# Altium footprint library Hydra_Ref_pcb.PcbLib: 353 footprints (part 17 of 23)
Each footprint in its own frame and in the unit in brackets; x right, y up, seen from the top. Pads: shape width x height; smd on the part's side, far side on the other; paste and mask are expansions set on the pad; w line width, h text height; cw(c..) or ccw(c..) is an arc to the next point about the centre after c.
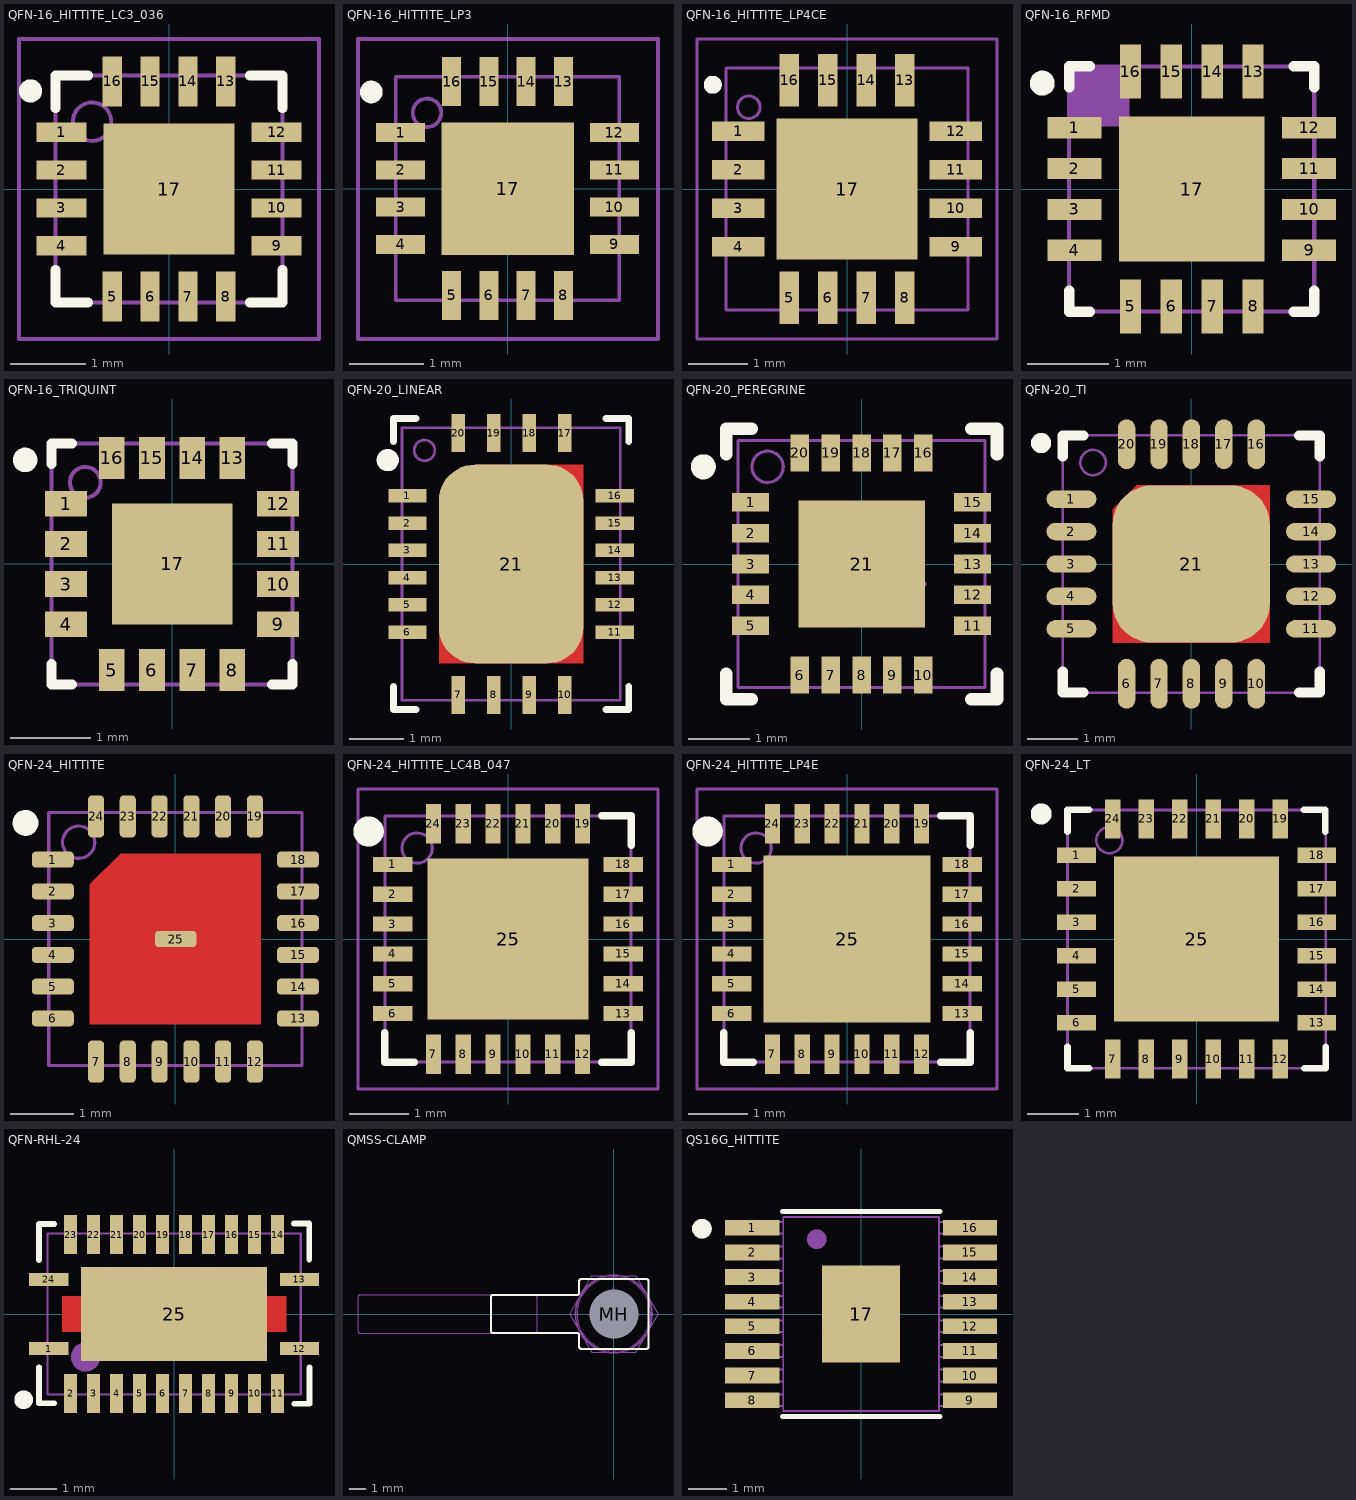
[diagram p16: the footprints below, top view; thin cyan lines are the x and y axes]

## QFN-16_HITTITE_LC3_036 [mil] "LC3 – 3 x 3 mm QFN CERAMIC  HIGH FREQUENCY SMT PACKAGE, 36mil height"
height 36
pads (17):
  rect 26x10 smd mask-13: 1(-56,29.55) 2(-56,9.85) 3(-56,-9.85) 4(-56,-29.55) 9(56,-29.55) 10(56,-9.85) 11(56,9.85) 12(56,29.55)
  rect 10x26 smd mask-13: 5(-29.55,-56) 6(-9.85,-56) 7(9.85,-56) 8(29.55,-56) 13(29.55,56) 14(9.85,56) 15(-9.85,56) 16(-29.55,56)
  rect 68x68 smd paste-34 mask-34: 17(0,0)
Top Overlay:
  circle w6: c-72,51 r3
  lines w5: -59,-42 -59,-59 -42,-59 ; -59,42 -59,59 -42,59 ; 42,-59 59,-59 59,-42 ; 42,59 59,59 59,42
Top Paste:
  region: -30,20 -20,30 30,30 30,-30 -30,-30
Top Solder:
  region: -30,20 -20,30 30,30 30,-30 -30,-30
  region: -38.5,69 -38.5,43.5 -34,39 34,39 38.5,43.5 38.5,69
  region: -69,-38.5 -43.5,-38.5 -39,-34 -39,34 -43.5,38.5 -69,38.5
  region: 38.5,-69 38.5,-43.5 34,-39 -34,-39 -38.5,-43.5 -38.5,-69
  region: 69,38.5 43.5,38.5 39,34 39,-34 43.5,-38.5 69,-38.5
  pour cut-out: -47.5,78 -47.5,47.5 -78,47.5 -78,-47.5 -47.5,-47.5 -47.5,-78 47.5,-78 47.5,-47.5 78,-47.5 78,47.5 47.5,47.5 47.5,78
9 Top Assy:
  circle w2: c-40,35 r10
  lines w2: -59.06,-59.06 59.06,-59.06 59.06,59.06 -59.06,59.06 -59.06,-59.06
  text ".Designator" at -43.74,-12.5 h25
15 Top Optical Placement:
  lines w2: -78,-78 78,-78 78,78 -78,78 -78,-78
  lines w3.94: -19.68,0 19.68,0 ; 0,-19.68 0,19.68
3D body: height 36, standoff 0, extent -59.04,-59.04 59.04,59.04

## QFN-16_HITTITE_LP3 [mil] "QFN-16 HITTITE"
height 39
pads (17):
  rect 26x10 smd paste+0 mask+0: 1(-56.5,29.53) 2(-56.5,9.84) 3(-56.5,-9.84) 4(-56.5,-29.53) 9(56.5,-29.53) 10(56.5,-9.84) 11(56.5,9.84) 12(56.5,29.53)
  rect 10x26 smd paste+0 mask+0: 5(-29.53,-56.5) 6(-9.84,-56.5) 7(9.84,-56.5) 8(29.53,-56.5) 13(29.53,56.5) 14(9.84,56.5) 15(-9.84,56.5) 16(-29.53,56.5)
  rect 70x70 smd paste-35 mask-35: 17(0,0)
Top Overlay:
  circle w6: c-72,51 r3
Top Paste:
  region: -29,19 -19,29 29,29 29,-29 -29,-29
Top Solder:
  region: -29,19 -19,29 29,29 29,-29 -29,-29
  region: 69.5,38.5 44,38.5 39.5,34 39.5,-34 44,-38.5 69.5,-38.5
  region: 38.5,-69.5 38.5,-44 34,-39.5 -34,-39.5 -38.5,-44 -38.5,-69.5
  region: -69.5,-38.5 -44,-38.5 -39.5,-34 -39.5,34 -44,38.5 -69.5,38.5
  region: -38.5,69.5 -38.5,44 -34,39.5 34,39.5 38.5,44 38.5,69.5
  pour cut-out: -48.5,79 -48.5,48.5 -79,48.5 -79,-48.5 -48.5,-48.5 -48.5,-79.5 48.5,-79.5 48.5,-48.5 79.5,-48.5 79.5,48.5 48.5,48.5 48.5,79
9 Top Assy:
  circle w2: c-42.54,40 r7.54
  lines w2: -59.06,-59.06 59.06,-59.06 59.06,59.06 -59.06,59.06 -59.06,-59.06
  text ".Designator" at -30,-9.84 h18
15 Top Optical Placement:
  lines w2: -79,-79.5 79.5,-79.5 79.5,79 -79,79 -79,-79.5
  lines w3.94: -19.68,0 19.68,0 ; 0,-19.68 0,19.68
3D body: height 39, standoff 0.39, extent -59.06,-59.06 59.23,59.06

## QFN-16_HITTITE_LP4CE [mil] "LP4C (E) – 4 x 4 mm QUAD FLATPACK  NO-LEAD (QFN) PLASTIC PACKAGE, 1mm"
height 39.37
pads (17):
  rect 35x13 smd paste+0 mask+0: 1(-72.5,38.39) 2(-72.5,12.8) 3(-72.5,-12.8) 4(-72.5,-38.39) 9(72.5,-38.39) 10(72.5,-12.8) 11(72.5,12.8) 12(72.5,38.39)
  rect 13x35 smd paste+0 mask+0: 5(-38.39,-72.5) 6(-12.8,-72.5) 7(12.8,-72.5) 8(38.39,-72.5) 13(38.39,72.5) 14(12.8,72.5) 15(-12.8,72.5) 16(-38.39,72.5)
  rect 94x94 smd paste-47 mask-47: 17(0,0)
Top Overlay:
  circle w6: c-89.5,69.5 r3
Top Paste:
  region: -40.5,26.5 -26.5,40.5 40.5,40.5 40.5,-40.5 -40.5,-40.5
Top Solder:
  pour cut-out: -60.5,100 -60.5,60.5 -100,60.5 -100,-60.5 -60.5,-60.5 -60.5,-100 60.5,-100 60.5,-60.5 100,-60.5 100,60.5 60.5,60.5 60.5,100
  region: -50.5,90 -50.5,55 -46,50.5 45.5,50.5 50.5,55.5 50.5,90
  region: -90,-50.5 -55.5,-50.5 -50.5,-45.5 -50.5,45.5 -55.5,50.5 -90,50.5
  region: 50.5,-90 50.5,-55.5 45.5,-50.5 -45.5,-50.5 -50,-55 -50,-90
  region: 90,50.5 55.5,50.5 50.5,45.5 50.5,-45.5 55.5,-50.5 90,-50.5
  region: -40.5,26.5 -26.5,40.5 40.5,40.5 40.5,-40.5 -40.5,-40.5
9 Top Assy:
  circle w2: c-65.5,54.5 r7.54
  lines w2: -80.71,-80.71 -80.71,80.71 80.71,80.71 80.71,-80.71 -80.71,-80.71
  text ".Designator" at -69.87,-9.84 h40
15 Top Optical Placement:
  lines w2: -100,-100 -100,100 100,100 100,-100 -100,-100
  lines w3.94: -19.68,0 19.68,0 ; 0,-19.68 0,19.68
3D body: height 39.37, standoff 0, extent -80.71,-80.71 80.92,80.71

## QFN-16_RFMD [mil] "QFN-16 RFMD"
height 36.42
pads (17):
  rect 26x10.24 smd mask+2: 1(-56.5,29.53) 2(-56.5,9.84) 3(-56.5,-9.84) 4(-56.5,-29.53) 9(56.5,-29.53) 10(56.5,-9.84) 11(56.5,9.84) 12(56.5,29.53)
  rect 10.24x26 smd mask+2: 5(-29.53,-56.5) 6(-9.84,-56.5) 7(9.84,-56.5) 8(29.53,-56.5) 13(29.53,56.5) 14(9.84,56.5) 15(-9.84,56.5) 16(-29.53,56.5)
  rect 70x70 smd mask-6: 17(0,0)
Top Overlay:
  circle w6: c-72,51 r3
  lines w5: -59.06,-49.06 -59.06,-59.06 -49.06,-59.06 ; -59.06,49.06 -59.06,59.06 -49.06,59.06 ; 49.06,-59.06 59.06,-59.06 59.06,-49.06 ; 49.06,59.06 59.06,59.06 59.06,49.06
9 Top Assy:
  rectangle: -59.06,30 -30,59.06
  lines w2: -59.06,-59.06 59.06,-59.06 59.06,59.06 -59.06,59.06 -59.06,-59.06
  text ".Designator" at -30,-9.84 h18
3D body: height 36.42, standoff 0.39, extent -59.06,-59.06 59.23,59.06

## QFN-16_TRIQUINT [mm] "QFN-16 TRIQUINT"
height 0.851
pads (17):
  rect 0.52x0.32 smd paste-0.006 mask+0.032: 1(-1.32,0.75) 2(-1.32,0.25) 3(-1.32,-0.25) 4(-1.32,-0.75) 9(1.32,-0.75) 10(1.32,-0.25) 11(1.32,0.25) 12(1.32,0.75)
  rect 0.32x0.52 smd paste-0.006 mask+0.032: 5(-0.75,-1.32) 6(-0.25,-1.32) 7(0.25,-1.32) 8(0.75,-1.32) 13(0.75,1.32) 14(0.25,1.32) 15(-0.25,1.32) 16(-0.75,1.32)
  rect 1.5x1.5 smd mask+0.051: 17(0,0)
Top Overlay:
  circle w0.152: c-1.829,1.295 r0.076
  lines w0.127: -1.5,-1.246 -1.5,-1.5 -1.246,-1.5 ; -1.5,1.246 -1.5,1.5 -1.246,1.5 ; 1.246,-1.5 1.5,-1.5 1.5,-1.246 ; 1.246,1.5 1.5,1.5 1.5,1.246
Top Solder:
  pour cut-out: -1.829,1.829 1.829,1.829 1.829,-1.829 -1.829,-1.829
9 Top Assy:
  circle w0.051: c-1.081,1.016 r0.192
  lines w0.051: -1.5,-1.5 1.5,-1.5 1.5,1.5 -1.5,1.5 -1.5,-1.5
  text ".Designator" at -0.762,-0.25 h0.46
3D body: height 0.85, standoff 0.01, extent -1.5,-1.5 1.504,1.5

## QFN-20_LINEAR [mm] "QFN-20 TEXAS INSTRUMENTS"
height 1.016
pads (21):
  rect 0.7x0.25 smd mask+0.051: 1(-1.9,1.25) 2(-1.9,0.75) 3(-1.9,0.25) 4(-1.9,-0.25) 5(-1.9,-0.75) 6(-1.9,-1.25) 11(1.9,-1.25) 12(1.9,-0.75) 13(1.9,-0.25) 14(1.9,0.25) 15(1.9,0.75) 16(1.9,1.25)
  rect 0.25x0.7 smd mask+0.051: 7(-0.968,-2.4) 8(-0.318,-2.4) 9(0.332,-2.4) 10(0.982,-2.4) 17(0.982,2.4) 18(0.332,2.4) 19(-0.318,2.4) 20(-0.968,2.4)
  rrect50% 2.65x3.65 smd mask-0.051: 21(0,0)
Top Layer:
  rectangle: -0.66,-1.825 1.325,1.825
  rectangle: -1.325,-1.825 1.325,-0.838
Top Overlay:
  circle w0.203: c-2.261,1.905 r0.102
  lines w0.127: -2.157,-2.249 -2.157,-2.667 -1.739,-2.667 ; -2.157,2.249 -2.157,2.667 -1.739,2.667 ; 1.739,-2.667 2.157,-2.667 2.157,-2.249 ; 1.739,2.667 2.157,2.667 2.157,2.249
Top Solder:
  rectangle: -1.27,-1.778 1.27,1.25
  region: 1.27,1.778 0,1.778 0,-1.25 1.27,-1.25
9 Top Assy:
  circle w0.051: c-1.587,2.083 r0.19
  lines w0.051: -2,-2.5 -2,2.5 2,2.5 2,-2.5 -2,-2.5
  text ".Designator" at -1.27,-0.326 h0.46
15 Top Optical Placement:
  lines w0.1: -0.001,-0.326 0.999,-0.326 ; 0.499,-0.826 0.499,0.174
3D body: height 0.76, standoff 0.01, extent -2,-2.5 2.002,2.5

## QFN-20_PEREGRINE [mm] "QFN-20 TPEREGRINE SEMICONDUCTOR"
height 1.016
pads (21):
  rect 0.6x0.3 smd mask+0.051: 1(-1.8,1) 2(-1.8,0.5) 3(-1.8,0) 4(-1.8,-0.5) 5(-1.8,-1) 11(1.8,-1) 12(1.8,-0.5) 13(1.8,0) 14(1.8,0.5) 15(1.8,1)
  rect 0.3x0.6 smd mask+0.051: 6(-1,-1.8) 7(-0.5,-1.8) 8(0.004,-1.8) 9(0.5,-1.8) 10(1,-1.8) 16(1,1.8) 17(0.5,1.8) 18(0.004,1.8) 19(-0.5,1.8) 20(-1,1.8)
  rect 2.05x2.05 smd mask+0.102: 21(0,0)
Top Overlay:
  circle w0.203: c-2.565,1.575 r0.102
  lines w0.203: -2.194,-1.776 -2.194,-2.194 -1.776,-2.194 ; -2.194,1.776 -2.194,2.194 -1.776,2.194 ; 1.776,-2.194 2.194,-2.194 2.194,-1.776 ; 1.776,2.194 2.194,2.194 2.194,1.776
9 Top Assy:
  circle w0.051: c-1.524,1.575 r0.254
  lines w0.051: -2,-2 -2,2 2,2 2,-2 -2,-2
  text ".Designator" at -1.27,-0.326 h0.46
15 Top Optical Placement:
  lines w0.1: -0.001,-0.326 0.999,-0.326 ; 0.499,-0.826 0.499,0.174
3D body: height 1.02, standoff 0.01, extent -2,-2 2.007,2

## QFN-20_TI [mm] "QFN-20 TEXAS INSTRUMENTS"
height 1.016
pads (21):
  oval 1x0.35 smd mask+0.051: 1(-2.4,1.3) 2(-2.4,0.65) 3(-2.4,0) 4(-2.4,-0.65) 5(-2.4,-1.3) 11(2.4,-1.3) 12(2.4,-0.65) 13(2.4,0) 14(2.4,0.65) 15(2.4,1.3)
  oval 0.35x1 smd mask+0.051: 6(-1.296,-2.4) 7(-0.646,-2.4) 8(0.004,-2.4) 9(0.654,-2.4) 10(1.304,-2.4) 16(1.304,2.4) 17(0.654,2.4) 18(0.004,2.4) 19(-0.646,2.4) 20(-1.296,2.4)
  rrect50% 3.15x3.15 smd mask+0.051: 21(0,0)
Top Layer:
  region: 1.575,1.575 -1.092,1.575 -1.575,1.092 -1.575,-1.575 1.575,-1.575
Top Overlay:
  circle w0.203: c-3.009,2.423 r0.102
  lines w0.203: -2.575,-2.157 -2.575,-2.575 -2.157,-2.575 ; -2.575,2.157 -2.575,2.575 -2.157,2.575 ; 2.157,-2.575 2.575,-2.575 2.575,-2.157 ; 2.157,2.575 2.575,2.575 2.575,2.157
Top Solder:
  rectangle: -1.626,-1.626 1.626,1.626
9 Top Assy:
  circle w0.051: c-1.967,2.032 r0.254
  lines w0.051: -2.575,-2.575 2.575,-2.575 2.575,2.575 -2.575,2.575 -2.575,-2.575
  text ".Designator" at -1.27,-0.326 h0.46
15 Top Optical Placement:
  lines w0.1: -0.001,-0.326 0.999,-0.326 ; 0.499,-0.826 0.499,0.174
3D body: height 0.76, standoff 0.01, extent -2.575,-2.575 2.582,2.575

## QFN-24_HITTITE [mil] "QFN-24 HITTITE"
height 40
pads (25):
  rrect50% 26x10 smd mask+2: 1(-76,49.25) 2(-76,29.55) 3(-76,9.85) 4(-76,-9.85) 5(-76,-29.55) 6(-76,-49.25) 13(76,-49.25) 14(76,-29.55) 15(76,-9.85) 16(76,9.85) 17(76,29.55) 18(76,49.25) 25(0.17,0)
  rrect50% 10x26 smd mask+2: 7(-49.25,-76) 8(-29.55,-76) 9(-9.85,-76) 10(9.85,-76) 11(29.55,-76) 12(49.25,-76) 19(49.25,76) 20(29.55,76) 21(9.85,76) 22(-9.85,76) 23(-29.55,76) 24(-49.25,76)
Top Layer:
  region: 53,53 -34,53 -53,34 -53,-53 53,-53
Top Overlay:
  circle w8: c-93,72 r4
Top Paste:
  rectangle: -41,-41 41,41
Top Solder:
  rectangle: -49,-49 49,49
9 Top Assy:
  circle w2: c-60,60 r10
  lines w2: -78.5,-78.5 -78.5,78.5 78.5,78.5 78.5,-78.5 -78.5,-78.5
  text ".Designator" at -68,-16 h50
15 Top Optical Placement:
  lines w3.94: -0.03,-12.83 39.34,-12.83 ; 19.65,-32.51 19.65,6.86
3D body: height 40, standoff 0.39, extent -78.5,-78.5 78.52,78.5

## QFN-24_HITTITE_LC4B_047 [mil] "LC4B – 4 x 4 mm QFN CERAMIC  HIGH FREQUENCY SMT PACKAGE, 47mil height"
height 47
pads (25):
  rect 26x10 smd mask-13: 1(-76,49.25) 2(-76,29.55) 3(-76,9.85) 4(-76,-9.85) 5(-76,-29.55) 6(-76,-49.25) 13(76,-49.25) 14(76,-29.55) 15(76,-9.85) 16(76,9.85) 17(76,29.55) 18(76,49.25)
  rect 10x26 smd mask-13: 7(-49.25,-76) 8(-29.55,-76) 9(-9.85,-76) 10(9.85,-76) 11(29.55,-76) 12(49.25,-76) 19(49.25,76) 20(29.55,76) 21(9.85,76) 22(-9.85,76) 23(-29.55,76) 24(-49.25,76)
  rect 106x106 smd paste-53 mask-53: 25(0,0)
Top Overlay:
  circle w10: c-92,71 r5
  lines w5: -81.3,-62 -81.3,-81.3 -62,-81.3 ; 62,-81.3 81.3,-81.3 81.3,-62 ; 62,81.3 81.3,81.3 81.3,62
Top Paste:
  region: -49,29 -29,49 49,49 49,-49 -49,-49
Top Solder:
  pour cut-out: -68,99 -68,68 -99,68 -99,-68 -68,-68 -68,-99 68,-99 68,-68 99,-68 99,68 68,68 68,99
  region: -49,29 -29,49 49,49 49,-49 -49,-49
  region: -58,-89 -58,-62 -55,-59 55,-59 58,-62 58,-89
  region: 89,-58 62,-58 59,-55 59,55 62,58 89,58
  region: 58,89 58,62 55,59 -55,59 -58,62 -58,89
  region: -89,58 -62,58 -59,55 -59,-55 -62,-58 -89,-58
9 Top Assy:
  circle w2: c-60,60 r10
  lines w2: -81.3,-81.3 -81.3,81.3 81.3,81.3 81.3,-81.3 -81.3,-81.3
  text ".Designator" at -69.97,-19.99 h40
15 Top Optical Placement:
  lines w2: -99,-99 -99,99 99,99 99,-99 -99,-99
  lines w3.94: -19.68,0 19.68,0 ; 0,-19.68 0,19.68
3D body: height 47, standoff 0, extent -81.28,-81.28 81.28,81.28

## QFN-24_HITTITE_LP4E [mil] "LLP4 (E) – 4 x 4 mm QUAD FLATPACK  NO-LEAD (QFN) PLASTIC PACKAGE, 39mil height"
height 39
pads (25):
  rect 26x10 smd mask-13: 1(-76,49.25) 2(-76,29.55) 3(-76,9.85) 4(-76,-9.85) 5(-76,-29.55) 6(-76,-49.25) 13(76,-49.25) 14(76,-29.55) 15(76,-9.85) 16(76,9.85) 17(76,29.55) 18(76,49.25)
  rect 10x26 smd mask-13: 7(-49.25,-76) 8(-29.55,-76) 9(-9.85,-76) 10(9.85,-76) 11(29.55,-76) 12(49.25,-76) 19(49.25,76) 20(29.55,76) 21(9.85,76) 22(-9.85,76) 23(-29.55,76) 24(-49.25,76)
  rect 110x110 smd paste-55 mask-55: 25(0,0)
Top Overlay:
  circle w10: c-92,71 r5
  lines w5: -81.3,-62 -81.3,-81.3 -62,-81.3 ; 62,-81.3 81.3,-81.3 81.3,-62 ; 62,81.3 81.3,81.3 81.3,62
Top Paste:
  region: -49,29 -29,49 49,49 49,-49 -49,-49
Top Solder:
  pour cut-out: -68,99 -68,68 -99,68 -99,-68 -68,-68 -68,-99 68,-99 68,-68 99,-68 99,68 68,68 68,99
  region: -89,58 -62,58 -59,55 -59,-55 -62,-58 -89,-58
  region: 58,89 58,62 55,59 -55,59 -58,62 -58,89
  region: 89,-58 62,-58 59,-55 59,55 62,58 89,58
  region: -58,-89 -58,-62 -55,-59 55,-59 58,-62 58,-89
  region: -49,29 -29,49 49,49 49,-49 -49,-49
9 Top Assy:
  circle w2: c-60,60 r10
  lines w2: -81.3,-81.3 81.3,-81.3 81.3,81.3 -81.3,81.3 -81.3,-81.3
  text ".Designator" at -69.97,-19.99 h40
15 Top Optical Placement:
  lines w2: -99,-99 99,-99 99,99 -99,99 -99,-99
  lines w3.94: -19.68,0 19.68,0 ; 0,-19.68 0,19.68
3D body: height 39, standoff 0, extent -81.28,-81.28 81.28,81.28

## QFN-24_LT [mm] "QFN-24 LINEAR TECHNOLOGY"
height 0.762
pads (25):
  rect 0.75x0.3 smd mask+0.051: 1(-2.325,1.624) 2(-2.325,0.974) 3(-2.325,0.324) 4(-2.325,-0.326) 5(-2.325,-0.976) 6(-2.325,-1.626) 13(2.325,-1.626) 14(2.325,-0.976) 15(2.325,-0.326) 16(2.325,0.324) 17(2.325,0.974) 18(2.325,1.624)
  rect 0.3x0.75 smd mask+0.051: 7(-1.626,-2.325) 8(-0.976,-2.325) 9(-0.326,-2.325) 10(0.324,-2.325) 11(0.974,-2.325) 12(1.624,-2.325) 19(1.624,2.325) 20(0.974,2.325) 21(0.324,2.325) 22(-0.326,2.325) 23(-0.976,2.325) 24(-1.626,2.325)
  rect 3.2x3.2 smd mask+0.051: 25(0,-0.001)
Top Overlay:
  circle w0.203: c-3.009,2.423 r0.102
  lines w0.127: -2.501,-2.083 -2.501,-2.501 -2.083,-2.501 ; -2.501,2.081 -2.501,2.499 -2.083,2.499 ; 2.075,2.499 2.493,2.499 2.493,2.081 ; 2.083,-2.501 2.501,-2.501 2.501,-2.083
9 Top Assy:
  circle w0.051: c-1.688,1.915 r0.254
  lines w0.051: -2.501,-2.501 2.499,-2.501 2.499,2.499 -2.501,2.499 -2.501,-2.501
  text ".Designator" at -1.859,-0.154 h0.46
15 Top Optical Placement:
  lines w0.1: -0.001,-0.326 0.999,-0.326 ; 0.499,-0.826 0.499,0.174
3D body: height 0.76, standoff 0.01, extent -2.501,-2.501 2.501,2.499

## QFN-RHL-24 [mm] "RHL (R-PVQFN-N24); 5.5 X 3.5 MM"
height 1
pads (25):
  rect 0.85x0.28 smd mask+0.051: 1(-2.725,-0.75) 12(2.725,-0.75) 13(2.725,0.75) 24(-2.725,0.75)
  rect 0.28x0.85 smd mask+0.051: 2(-2.25,-1.725) 3(-1.75,-1.725) 4(-1.25,-1.725) 5(-0.75,-1.725) 6(-0.25,-1.725) 7(0.25,-1.725) 8(0.75,-1.725) 9(1.25,-1.725) 10(1.75,-1.725) 11(2.25,-1.725) 14(2.25,1.725) 15(1.75,1.725) 16(1.25,1.725) 17(0.75,1.725) 18(0.25,1.725) 19(-0.25,1.725) 20(-0.75,1.725) 21(-1.25,1.725) 22(-1.75,1.725) 23(-2.25,1.725)
  rect 4.05x2.05 smd mask-0.102: 25(0,0)
Top Layer:
  region: 2.438,0.387 1.651,0.387 1.651,-0.387 2.438,-0.387
  rectangle: -2.438,-0.387 -1.651,0.387
Top Overlay:
  circle w0.203: c-3.269,-1.863 r0.102
  lines w0.127: -2.937,-1.157 -2.937,-1.941 -2.605,-1.941 ; -2.938,1.175 -2.938,1.959 -2.606,1.959 ; 2.606,1.966 2.938,1.966 2.938,1.181 ; 2.613,-1.95 2.945,-1.95 2.945,-1.166
9 Top Assy:
  circle w0.381: c-1.926,-0.934 r0.127
  lines w0.051: -2.75,-1.75 2.75,-1.75 2.75,1.75 -2.75,1.75 -2.75,-1.75
  text ".Designator" at -2.582,-0.389 h1.47
3D body: height 1, standoff 0.01, extent -2.75,-1.75 2.75,1.75

## QMSS-CABLE-PROXY_A1 [mil]
3D body: height 583.6, standoff -906.4, extent -1900,-920 1900,290

## QMSS-CLAMP [mil] "connector retaining clip, KFHS-440-12 stud, nut"
height 750
pads (1):
  round 112 / inner round 112 / far side round 180 hole 120 unplated: MH(0,0)
Top Overlay:
  lines w5: -300,-41.5 ccw(c-295,-41.5) -295,-46.5 -90,-46.5 cw(c-90,-51.5) -85,-51.5 -85,-80 ccw(c-80,-80) -80,-85 80,-85 ccw(c80,-80) 85,-80 85,80 ccw(c80,80) 80,85 -80,85 ccw(c-80,80) -85,80 -85,51.5 cw(c-90,51.5) -90,46.5 -295,46.5 ccw(c-295,41.5) -300,41.5 -300,-41.5
Bottom Overlay:
  circle w5: c0,0 r95
8 Bott Assy:
  circle w2: c0,0 r95
9 Top Assy:
  lines w2: -300,-41.5 ccw(c-295,-41.5) -295,-46.5 -90,-46.5 cw(c-90,-51.5) -85,-51.5 -85,-80 ccw(c-80,-80) -80,-85 80,-85 ccw(c80,-80) 85,-80 85,80 ccw(c80,80) 80,85 -80,85 ccw(c-80,80) -85,80 -85,51.5 cw(c-90,51.5) -90,46.5 -295,46.5 ccw(c-295,41.5) -300,41.5 -300,-41.5
  text ".Designator" at -285,-19.99 h40
15 Top Optical Placement:
  lines w2: -65,0 0,0 ; 0,-65 0,0 ; 0,65 0,0 ; 65,0 0,0 ; -300,-41.5 ccw(c-295,-41.5) -295,-46.5 -90,-46.5 cw(c-90,-51.5) -85,-51.5 -85,-80 ccw(c-80,-80) -80,-85 80,-85 ccw(c80,-80) 85,-80 85,80 ccw(c80,80) 80,85 -80,85 ccw(c-80,80) -85,80 -85,51.5 cw(c-90,51.5) -90,46.5 -295,46.5 ccw(c-295,41.5) -300,41.5 -300,-41.5
Mechanical 29:
  circle w2: c0,0 r90
  lines w2: -295,-46.5 cw(c-295,-41.5) -300,-41.5 -300,41.5 cw(c-295,41.5) -295,46.5 ; -58.89,-85 -53.98,-93.5 53.98,-93.5 58.89,-85 ; -58.89,85 -53.98,93.5 53.98,93.5 58.89,85 ; -37.69,-85.02 ccw(c0,0) 37.69,-85.02 ; -37.69,85.02 cw(c0,0) 37.69,85.02 ; -29.49,-85 -80,-85 cw(c-80,-80) -85,-80 -85,-51.5 ccw(c-90,-51.5) -90,-46.5 -620,-46.5 cw(c-620,-41.5) -625,-41.5 -625,41.5 cw(c-620,41.5) -620,46.5 -90,46.5 ccw(c-90,51.5) -85,51.5 -85,80 cw(c-80,80) -80,85 -29.49,85 ; 29.49,-85 80,-85 ccw(c80,-80) 85,-80 85,-29.49 ; 29.49,85 80,85 cw(c80,80) 85,80 85,29.49 ; 85,-39.78 107.96,0 85,39.78 ; 85.01,-37.71 ccw(c0,0) 85.01,37.71
  text "QMSS-CLAMP" at -317.55,-15 h30
Mechanical 30:
  circle w2: c0,0 r93
  circle w2: c0,0 r56
  circle w2: c0,0 r41.1
  circle w2: c0,0 r16.8
  lines w2: -192.5,-46.5 ccw(c-192.5,-41.5) -187.5,-41.5 -187.5,41.5 ccw(c-192.5,41.5) -192.5,46.5 ; -58.89,-85 -80,-85 cw(c-80,-80) -85,-80 -85,-51.5 ccw(c-90,-51.5) -90,-46.5 -620,-46.5 cw(c-620,-41.5) -625,-41.5 -625,41.5 cw(c-620,41.5) -620,46.5 -90,46.5 ccw(c-90,51.5) -85,51.5 -85,80 cw(c-80,80) -80,85 -58.89,85 ; 58.89,-85 80,-85 ccw(c80,-80) 85,-80 85,-39.78 ; 58.89,85 80,85 cw(c80,80) 85,80 85,39.78 ; -107.96,0 -53.98,93.5 53.98,93.5 107.96,0 53.98,-93.5 -53.98,-93.5 -107.96,0
  text "QMSS-CLAMP" at -607.45,-15 h30
Mechanical 31:
  circle w2: c0,0 r56
3D body: height 0, standoff -750, extent -55.98,-55.98 55.98,55.98
3D body: height 540, standoff 480, extent -107.96,-93.5 107.96,93.5
3D body: height 480, standoff 0, extent -299.98,-84.98 84.98,84.98
3D body: height 600, standoff 480, extent -299.98,-46.48 -187.52,46.48
3D body: height 750, standoff 600, extent -624.98,-46.48 -187.52,46.48
3D body: height 20, standoff 0, extent -89.98,-89.98 89.98,89.98

## QS16G_HITTITE [mil] "Hittite 16+1 Pin Plastic SSOP"
height 69
pads (17):
  rect 55x16 smd: 1(-110.5,87.5) 2(-110.5,62.5) 3(-110.5,37.5) 4(-110.5,12.5) 5(-110.5,-12.5) 6(-110.5,-37.5) 7(-110.5,-62.5) 8(-110.5,-87.5) 9(110.5,-87.5) 10(110.5,-62.5) 11(110.5,-37.5) 12(110.5,-12.5) 13(110.5,12.5) 14(110.5,37.5) 15(110.5,62.5) 16(110.5,87.5)
  rect 79x98 smd: 17(0,0)
Top Overlay:
  circle w10: c-161.57,86.61 r5
  lines w5: -80,-104 80,-104 ; -80,104 80,104
9 Top Assy:
  circle w10: c-45,76 r5
  lines w2: -100,-93.5 -100,-81.5 ; -100,-68.5 -100,-56.5 ; -100,-43.5 -100,-31.5 ; -100,-18.5 -100,-6.5 ; -100,6.5 -100,18.5 ; -100,31.5 -100,43.5 ; -100,56.5 -100,68.5 ; -100,81.5 -100,93.5 ; -79,-93.5 -115,-93.5 -115,-81.5 -79,-81.5 ; -79,-68.5 -115,-68.5 -115,-56.5 -79,-56.5 ; -79,-43.5 -115,-43.5 -115,-31.5 -79,-31.5 ; -79,-18.5 -115,-18.5 -115,-6.5 -79,-6.5 ; -79,0 -79,12.5 ; -79,6.5 -115,6.5 -115,18.5 -79,18.5 ; -79,31.5 -115,31.5 -115,43.5 -79,43.5 ; -79,56.5 -115,56.5 -115,68.5 -79,68.5 ; -79,81.5 -115,81.5 -115,93.5 -79,93.5 ; 79,-93.5 115,-93.5 115,-81.5 79,-81.5 ; 79,-68.5 115,-68.5 115,-56.5 79,-56.5 ; 79,-43.5 115,-43.5 115,-31.5 79,-31.5 ; 79,-18.5 115,-18.5 115,-6.5 79,-6.5 ; 79,0 79,12.5 ; 79,6.5 115,6.5 115,18.5 79,18.5 ; 79,31.5 115,31.5 115,43.5 79,43.5 ; 79,56.5 115,56.5 115,68.5 79,68.5 ; 79,81.5 115,81.5 115,93.5 79,93.5 ; 100,-93.5 100,-81.5 ; 100,-68.5 100,-56.5 ; 100,-43.5 100,-31.5 ; 100,-18.5 100,-6.5 ; 100,6.5 100,18.5 ; 100,31.5 100,43.5 ; 100,56.5 100,68.5 ; 100,81.5 100,93.5 ; -79,-98.5 79,-98.5 79,98.5 -79,98.5 -79,-98.5
  text ".Designator" at -51,-9 h25
3D body: height 69, standoff 0, extent -78.94,-98.18 79.19,98.59